# Altium footprint library CONN_HDR_1.27MM_ST.PcbLib: 116 footprints (part 2 of 9)
Each footprint in its own frame and in the unit in brackets; x right, y up, seen from the top. Pads: shape width x height; smd on the part's side, far side on the other; paste and mask are expansions set on the pad; w line width, h text height; cw(c..) or ccw(c..) is an arc to the next point about the centre after c.
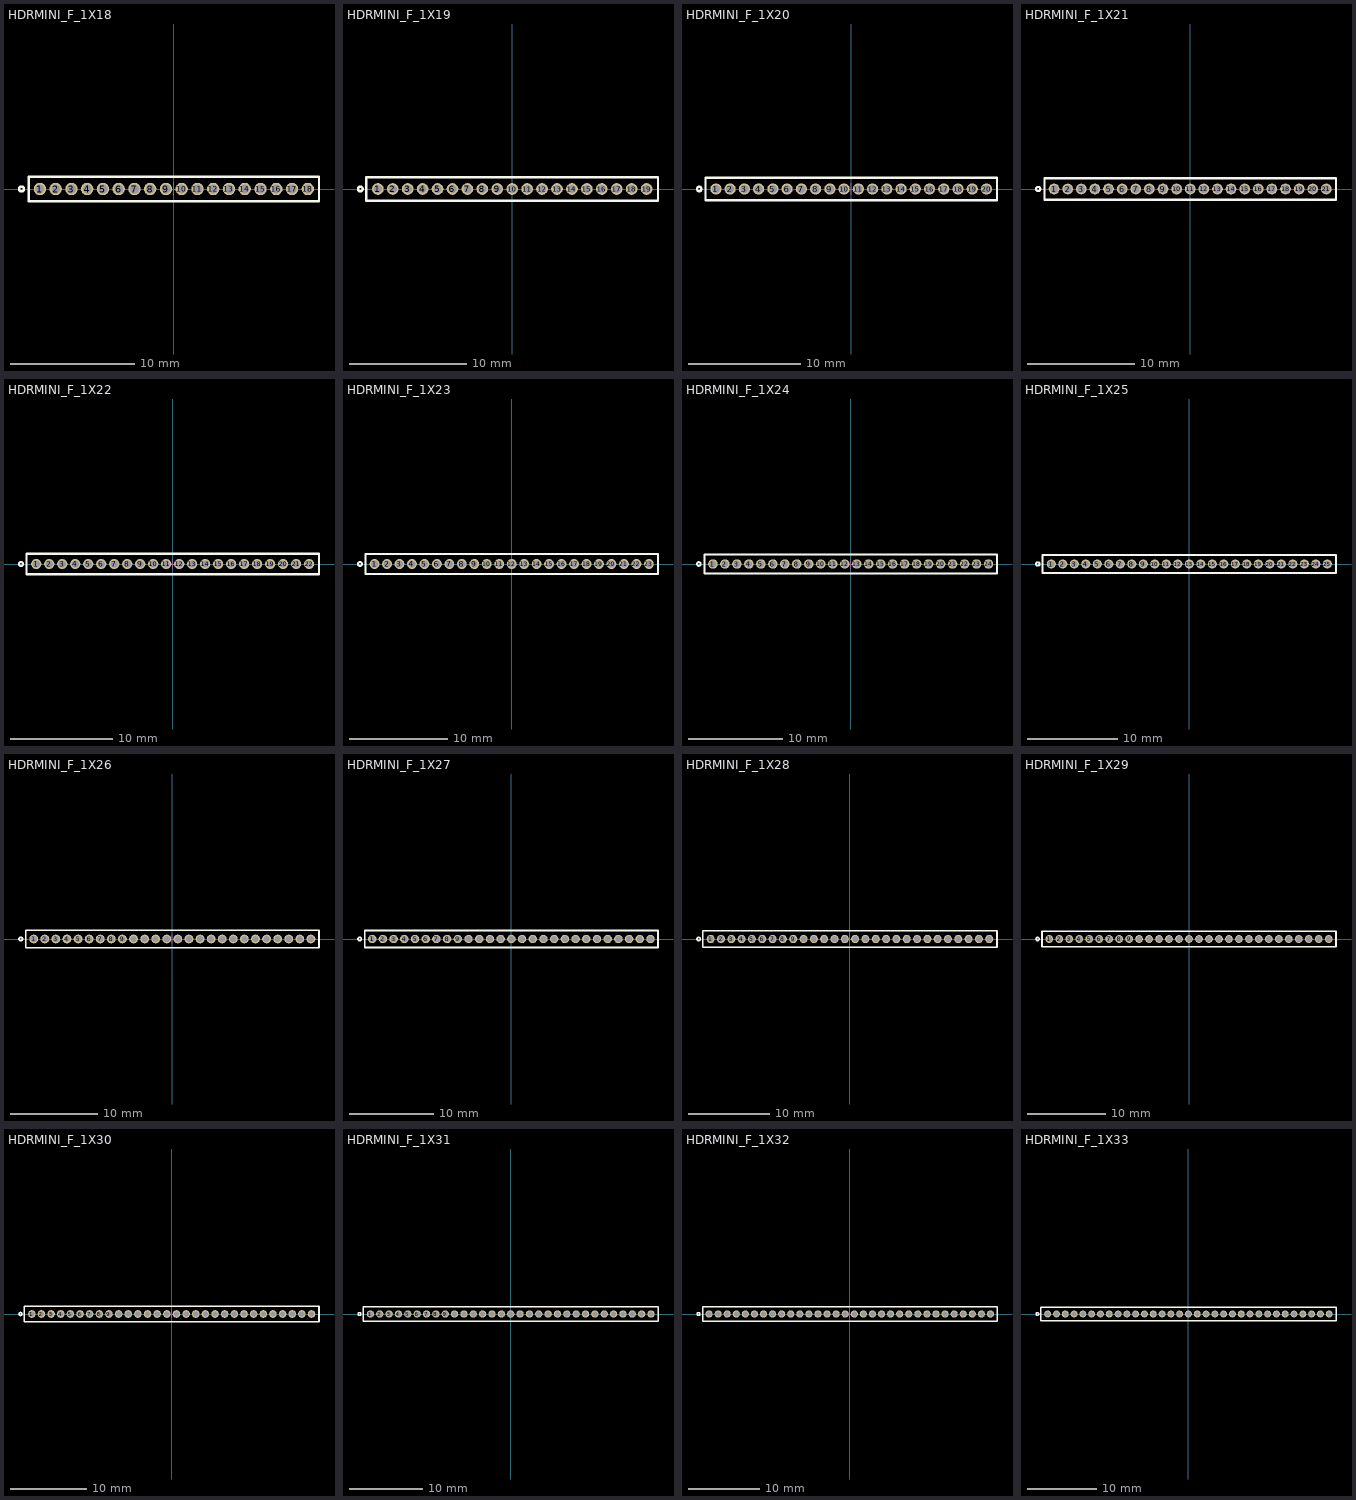
[diagram p1: the footprints below, top view; thin cyan lines are the x and y axes]

## HDRMINI_F_1X18 [mm] "mini header (50mil pitch)"
pads (18):
  round 1 / inner round 1 / far side oval 1x1.4 hole 0.7 mask+0.05: 1(-10.795,0) 2(-9.525,0) 3(-8.255,0) 4(-6.985,0) 5(-5.715,0) 6(-4.445,0) 7(-3.175,0) 8(-1.905,0) 9(-0.635,0) 10(0.635,0) 11(1.905,0) 12(3.175,0) 13(4.445,0) 14(5.715,0) 15(6.985,0) 16(8.255,0) 17(9.525,0) 18(10.795,0)
Top Overlay:
  circle w0.2: c-12.28,0 r0.2
  lines w0.2: -11.7,-1 11.7,-1 11.7,1 -11.7,1 -11.7,-1
Mechanical 1:
  lines w0.1: -0.5,0 0.5,0 ; 0,-0.5 0,0.5
3D body "female_header_a-bl127-eg-g18d.stp": height 3.45, standoff -2.35, extent -11.63,-0.9 11.63,0.9

## HDRMINI_F_1X19 [mm] "mini header (50mil pitch)"
pads (19):
  round 1 / inner round 1 / far side oval 1x1.4 hole 0.7 mask+0.05: 1(-11.43,0) 2(-10.16,0) 3(-8.89,0) 4(-7.62,0) 5(-6.35,0) 6(-5.08,0) 7(-3.81,0) 8(-2.54,0) 9(-1.27,0) 10(0,0) 11(1.27,0) 12(2.54,0) 13(3.81,0) 14(5.08,0) 15(6.35,0) 16(7.62,0) 17(8.89,0) 18(10.16,0) 19(11.43,0)
Top Overlay:
  circle w0.2: c-12.915,0 r0.2
  lines w0.2: -12.415,-1 12.4,-1 12.4,1 -12.415,1 -12.415,-1
Mechanical 1:
  lines w0.1: -0.5,0 0.5,0 ; 0,-0.5 0,0.5
3D body "female_header_a-bl127-eg-g19d.stp": height 3.45, standoff -2.35, extent -12.265,-0.9 12.265,0.9

## HDRMINI_F_1X20 [mm] "mini header (50mil pitch)"
pads (20):
  round 1 / inner round 1 / far side oval 1x1.4 hole 0.7 mask+0.05: 1(-12.065,0) 2(-10.795,0) 3(-9.525,0) 4(-8.255,0) 5(-6.985,0) 6(-5.715,0) 7(-4.445,0) 8(-3.175,0) 9(-1.905,0) 10(-0.635,0) 11(0.635,0) 12(1.905,0) 13(3.175,0) 14(4.445,0) 15(5.715,0) 16(6.985,0) 17(8.255,0) 18(9.525,0) 19(10.795,0) 20(12.065,0)
Top Overlay:
  circle w0.2: c-13.55,0 r0.2
  lines w0.2: -13,-1 -13,1 13,1 13,-1 -13,-1
Mechanical 1:
  lines w0.1: -0.5,0 0.5,0 ; 0,-0.5 0,0.5
3D body "female_header_a-bl127-eg-g20d.stp": height 3.45, standoff -2.35, extent -12.9,-0.9 12.9,0.9

## HDRMINI_F_1X21 [mm] "mini header (50mil pitch)"
pads (21):
  round 1 / inner round 1 / far side oval 1x1.4 hole 0.7 mask+0.05: 1(-12.7,0) 2(-11.43,0) 3(-10.16,0) 4(-8.89,0) 5(-7.62,0) 6(-6.35,0) 7(-5.08,0) 8(-3.81,0) 9(-2.54,0) 10(-1.27,0) 11(0,0) 12(1.27,0) 13(2.54,0) 14(3.81,0) 15(5.08,0) 16(6.35,0) 17(7.62,0) 18(8.89,0) 19(10.16,0) 20(11.43,0) 21(12.7,0)
Top Overlay:
  circle w0.2: c-14.185,0 r0.2
  lines w0.2: -13.6,-1 -13.6,1 13.6,1 13.6,-1 -13.6,-1
Mechanical 1:
  lines w0.1: -0.5,0 0.5,0 ; 0,-0.5 0,0.5
3D body "female_header_a-bl127-eg-g21d.stp": height 3.45, standoff -2.35, extent -13.535,-0.9 13.535,0.9

## HDRMINI_F_1X22 [mm] "mini header (50mil pitch)"
pads (22):
  round 1 / inner round 1 / far side oval 1x1.4 hole 0.7 mask+0.05: 1(-13.335,0) 2(-12.065,0) 3(-10.795,0) 4(-9.525,0) 5(-8.255,0) 6(-6.985,0) 7(-5.715,0) 8(-4.445,0) 9(-3.175,0) 10(-1.905,0) 11(-0.635,0) 12(0.635,0) 13(1.905,0) 14(3.175,0) 15(4.445,0) 16(5.715,0) 17(6.985,0) 18(8.255,0) 19(9.525,0) 20(10.795,0) 21(12.065,0) 22(13.335,0)
Top Overlay:
  circle w0.2: c-14.82,0 r0.2
  lines w0.2: -14.3,-1 -14.3,1 14.3,1 14.3,-1 -14.3,-1
Mechanical 1:
  lines w0.1: -0.5,0 0.5,0 ; 0,-0.5 0,0.5
3D body "female_header_a-bl127-eg-g22d.stp": height 3.45, standoff -2.35, extent -14.17,-0.9 14.17,0.9

## HDRMINI_F_1X23 [mm] "mini header (50mil pitch)"
pads (23):
  round 1 / inner round 1 / far side oval 1x1.4 hole 0.7 mask+0.05: 1(-13.97,0) 2(-12.7,0) 3(-11.43,0) 4(-10.16,0) 5(-8.89,0) 6(-7.62,0) 7(-6.35,0) 8(-5.08,0) 9(-3.81,0) 10(-2.54,0) 11(-1.27,0) 12(0,0) 13(1.27,0) 14(2.54,0) 15(3.81,0) 16(5.08,0) 17(6.35,0) 18(7.62,0) 19(8.89,0) 20(10.16,0) 21(11.43,0) 22(12.7,0) 23(13.97,0)
Top Overlay:
  circle w0.2: c-15.455,0 r0.2
  lines w0.2: -14.9,-1 -14.9,1 14.9,1 14.9,-1 -14.9,-1
Mechanical 1:
  lines w0.1: -0.5,0 0.5,0 ; 0,-0.5 0,0.5
3D body "female_header_a-bl127-eg-g23d.stp": height 3.45, standoff -2.35, extent -14.805,-0.9 14.805,0.9

## HDRMINI_F_1X24 [mm] "mini header (50mil pitch)"
pads (24):
  round 1 / inner round 1 / far side oval 1x1.4 hole 0.7 mask+0.05: 1(-14.605,0) 2(-13.335,0) 3(-12.065,0) 4(-10.795,0) 5(-9.525,0) 6(-8.255,0) 7(-6.985,0) 8(-5.715,0) 9(-4.445,0) 10(-3.175,0) 11(-1.905,0) 12(-0.635,0) 13(0.635,0) 14(1.905,0) 15(3.175,0) 16(4.445,0) 17(5.715,0) 18(6.985,0) 19(8.255,0) 20(9.525,0) 21(10.795,0) 22(12.065,0) 23(13.335,0) 24(14.605,0)
Top Overlay:
  circle w0.2: c-16.09,0 r0.2
  lines w0.2: -15.5,-1 15.5,-1 15.5,1 -15.5,1 -15.5,-1
Mechanical 1:
  lines w0.1: -0.5,0 0.5,0 ; 0,-0.5 0,0.5
3D body "female_header_a-bl127-eg-g24d.stp": height 3.45, standoff -2.35, extent -15.44,-0.9 15.44,0.9

## HDRMINI_F_1X25 [mm] "mini header (50mil pitch)"
pads (25):
  round 1 / inner round 1 / far side oval 1x1.4 hole 0.7 mask+0.05: 1(-15.24,0) 2(-13.97,0) 3(-12.7,0) 4(-11.43,0) 5(-10.16,0) 6(-8.89,0) 7(-7.62,0) 8(-6.35,0) 9(-5.08,0) 10(-3.81,0) 11(-2.54,0) 12(-1.27,0) 13(0,0) 14(1.27,0) 15(2.54,0) 16(3.81,0) 17(5.08,0) 18(6.35,0) 19(7.62,0) 20(8.89,0) 21(10.16,0) 22(11.43,0) 23(12.7,0) 24(13.97,0) 25(15.24,0)
Top Overlay:
  circle w0.2: c-16.725,0 r0.2
  lines w0.2: -16.2,-1 -16.2,1 16.2,1 16.2,-1 -16.2,-1
Mechanical 1:
  lines w0.1: -0.5,0 0.5,0 ; 0,-0.5 0,0.5
3D body "female_header_a-bl127-eg-g25d.stp": height 3.45, standoff -2.35, extent -16.075,-0.9 16.075,0.9

## HDRMINI_F_1X26 [mm] "mini header (50mil pitch)"
pads (26):
  round 1 / inner round 1 / far side oval 1x1.4 hole 0.7 mask+0.05: 1(-15.875,0) 2(-14.605,0) 3(-13.335,0) 4(-12.065,0) 5(-10.795,0) 6(-9.525,0) 7(-8.255,0) 8(-6.985,0) 9(-5.715,0) 10(-4.445,0) 11(-3.175,0) 12(-1.905,0) 13(-0.635,0) 14(0.635,0) 15(1.905,0) 16(3.175,0) 17(4.445,0) 18(5.715,0) 19(6.985,0) 20(8.255,0) 21(9.525,0) 22(10.795,0) 23(12.065,0) 24(13.335,0) 25(14.605,0) 26(15.875,0)
Top Overlay:
  circle w0.2: c-17.36,0 r0.2
  lines w0.2: -16.8,-1 -16.8,1 16.8,1 16.8,-1 -16.8,-1
Mechanical 1:
  lines w0.1: -0.5,0 0.5,0 ; 0,-0.5 0,0.5
3D body "female_header_a-bl127-eg-g26d.stp": height 3.45, standoff -2.35, extent -16.71,-0.9 16.71,0.9

## HDRMINI_F_1X27 [mm] "mini header (50mil pitch)"
pads (27):
  round 1 / inner round 1 / far side oval 1x1.4 hole 0.7 mask+0.05: 1(-16.51,0) 2(-15.24,0) 3(-13.97,0) 4(-12.7,0) 5(-11.43,0) 6(-10.16,0) 7(-8.89,0) 8(-7.62,0) 9(-6.35,0) 10(-5.08,0) 11(-3.81,0) 12(-2.54,0) 13(-1.27,0) 14(0,0) 15(1.27,0) 16(2.54,0) 17(3.81,0) 18(5.08,0) 19(6.35,0) 20(7.62,0) 21(8.89,0) 22(10.16,0) 23(11.43,0) 24(12.7,0) 25(13.97,0) 26(15.24,0) 27(16.51,0)
Top Overlay:
  circle w0.2: c-17.995,0 r0.2
  lines w0.2: -17.4,-1 -17.4,1 17.4,1 17.4,-1 -17.4,-1
Mechanical 1:
  lines w0.1: -0.5,0 0.5,0 ; 0,-0.5 0,0.5
3D body "female_header_a-bl127-eg-g27d.stp": height 3.45, standoff -2.35, extent -17.345,-0.9 17.345,0.9

## HDRMINI_F_1X28 [mm] "mini header (50mil pitch)"
pads (28):
  round 1 / inner round 1 / far side oval 1x1.4 hole 0.7 mask+0.05: 1(-17.145,0) 2(-15.875,0) 3(-14.605,0) 4(-13.335,0) 5(-12.065,0) 6(-10.795,0) 7(-9.525,0) 8(-8.255,0) 9(-6.985,0) 10(-5.715,0) 11(-4.445,0) 12(-3.175,0) 13(-1.905,0) 14(-0.635,0) 15(0.635,0) 16(1.905,0) 17(3.175,0) 18(4.445,0) 19(5.715,0) 20(6.985,0) 21(8.255,0) 22(9.525,0) 23(10.795,0) 24(12.065,0) 25(13.335,0) 26(14.605,0) 27(15.875,0) 28(17.145,0)
Top Overlay:
  circle w0.2: c-18.63,0 r0.2
  lines w0.2: -18.1,-1 18.1,-1 18.1,1 -18.1,1 -18.1,-1
Mechanical 1:
  lines w0.1: -0.5,0 0.5,0 ; 0,-0.5 0,0.5
3D body "female_header_a-bl127-eg-g28d.stp": height 3.45, standoff -2.35, extent -17.98,-0.9 17.98,0.9

## HDRMINI_F_1X29 [mm] "mini header (50mil pitch)"
pads (29):
  round 1 / inner round 1 / far side oval 1x1.4 hole 0.7 mask+0.05: 1(-17.78,0) 2(-16.51,0) 3(-15.24,0) 4(-13.97,0) 5(-12.7,0) 6(-11.43,0) 7(-10.16,0) 8(-8.89,0) 9(-7.62,0) 10(-6.35,0) 11(-5.08,0) 12(-3.81,0) 13(-2.54,0) 14(-1.27,0) 15(0,0) 16(1.27,0) 17(2.54,0) 18(3.81,0) 19(5.08,0) 20(6.35,0) 21(7.62,0) 22(8.89,0) 23(10.16,0) 24(11.43,0) 25(12.7,0) 26(13.97,0) 27(15.24,0) 28(16.51,0) 29(17.78,0)
Top Overlay:
  circle w0.2: c-19.265,0 r0.2
  lines w0.2: -18.7,-1 18.7,-1 18.7,1 -18.7,1 -18.7,-1
Mechanical 1:
  lines w0.1: -0.5,0 0.5,0 ; 0,-0.5 0,0.5
3D body "female_header_a-bl127-eg-g29d.stp": height 3.45, standoff -2.35, extent -18.615,-0.9 18.615,0.9

## HDRMINI_F_1X30 [mm] "mini header (50mil pitch)"
pads (30):
  round 1 / inner round 1 / far side oval 1x1.4 hole 0.7 mask+0.05: 1(-18.415,0) 2(-17.145,0) 3(-15.875,0) 4(-14.605,0) 5(-13.335,0) 6(-12.065,0) 7(-10.795,0) 8(-9.525,0) 9(-8.255,0) 10(-6.985,0) 11(-5.715,0) 12(-4.445,0) 13(-3.175,0) 14(-1.905,0) 15(-0.635,0) 16(0.635,0) 17(1.905,0) 18(3.175,0) 19(4.445,0) 20(5.715,0) 21(6.985,0) 22(8.255,0) 23(9.525,0) 24(10.795,0) 25(12.065,0) 26(13.335,0) 27(14.605,0) 28(15.875,0) 29(17.145,0) 30(18.415,0)
Top Overlay:
  circle w0.2: c-19.9,0 r0.2
  lines w0.2: -19.4,-1 19.4,-1 19.4,1 -19.4,1 -19.4,-1
Mechanical 1:
  lines w0.1: -0.5,0 0.5,0 ; 0,-0.5 0,0.5
3D body "female_header_a-bl127-eg-g30d.stp": height 3.45, standoff -2.35, extent -19.25,-0.9 19.25,0.9

## HDRMINI_F_1X31 [mm] "mini header (50mil pitch)"
pads (31):
  round 1 / inner round 1 / far side oval 1x1.4 hole 0.7 mask+0.05: 1(-19.05,0) 2(-17.78,0) 3(-16.51,0) 4(-15.24,0) 5(-13.97,0) 6(-12.7,0) 7(-11.43,0) 8(-10.16,0) 9(-8.89,0) 10(-7.62,0) 11(-6.35,0) 12(-5.08,0) 13(-3.81,0) 14(-2.54,0) 15(-1.27,0) 16(0,0) 17(1.27,0) 18(2.54,0) 19(3.81,0) 20(5.08,0) 21(6.35,0) 22(7.62,0) 23(8.89,0) 24(10.16,0) 25(11.43,0) 26(12.7,0) 27(13.97,0) 28(15.24,0) 29(16.51,0) 30(17.78,0) 31(19.05,0)
Top Overlay:
  circle w0.2: c-20.535,0 r0.2
  lines w0.2: -20,-1 20,-1 20,1 -20,1 -20,-1
Mechanical 1:
  lines w0.1: -0.5,0 0.5,0 ; 0,-0.5 0,0.5
3D body "female_header_a-bl127-eg-g31d.stp": height 3.45, standoff -2.35, extent -19.885,-0.9 19.885,0.9

## HDRMINI_F_1X32 [mm] "mini header (50mil pitch)"
pads (32):
  round 1 / inner round 1 / far side oval 1x1.4 hole 0.7 mask+0.05: 1(-19.685,0) 2(-18.415,0) 3(-17.145,0) 4(-15.875,0) 5(-14.605,0) 6(-13.335,0) 7(-12.065,0) 8(-10.795,0) 9(-9.525,0) 10(-8.255,0) 11(-6.985,0) 12(-5.715,0) 13(-4.445,0) 14(-3.175,0) 15(-1.905,0) 16(-0.635,0) 17(0.635,0) 18(1.905,0) 19(3.175,0) 20(4.445,0) 21(5.715,0) 22(6.985,0) 23(8.255,0) 24(9.525,0) 25(10.795,0) 26(12.065,0) 27(13.335,0) 28(14.605,0) 29(15.875,0) 30(17.145,0) 31(18.415,0) 32(19.685,0)
Top Overlay:
  circle w0.2: c-21.17,0 r0.2
  lines w0.2: -20.6,-1 20.6,-1 20.6,1 -20.6,1 -20.6,-1
Mechanical 1:
  lines w0.1: -0.5,0 0.5,0 ; 0,-0.5 0,0.5
3D body "female_header_a-bl127-eg-g32d.stp": height 3.45, standoff -2.35, extent -20.52,-0.9 20.52,0.9

## HDRMINI_F_1X33 [mm] "mini header (50mil pitch)"
pads (33):
  round 1 / inner round 1 / far side oval 1x1.4 hole 0.7 mask+0.05: 1(-20.32,0) 2(-19.05,0) 3(-17.78,0) 4(-16.51,0) 5(-15.24,0) 6(-13.97,0) 7(-12.7,0) 8(-11.43,0) 9(-10.16,0) 10(-8.89,0) 11(-7.62,0) 12(-6.35,0) 13(-5.08,0) 14(-3.81,0) 15(-2.54,0) 16(-1.27,0) 17(0,0) 18(1.27,0) 19(2.54,0) 20(3.81,0) 21(5.08,0) 22(6.35,0) 23(7.62,0) 24(8.89,0) 25(10.16,0) 26(11.43,0) 27(12.7,0) 28(13.97,0) 29(15.24,0) 30(16.51,0) 31(17.78,0) 32(19.05,0) 33(20.32,0)
Top Overlay:
  circle w0.2: c-21.805,0 r0.2
  lines w0.2: -21.3,-1 21.3,-1 21.3,1 -21.3,1 -21.3,-1
Mechanical 1:
  lines w0.1: -0.5,0 0.5,0 ; 0,-0.5 0,0.5
3D body "female_header_a-bl127-eg-g33d.stp": height 3.45, standoff -2.35, extent -21.155,-0.9 21.155,0.9